# Altium schematic symbol library jlcpcb_2025_04_inductors_extended_0603.schlib: 1269 symbols (part 6 of 7) (continued)
## SDWL1608C24NJSTF
designator L?  Inductance: 24nH
Inductor, 24nH, ±5%, 190mΩ, 490mA, SMD 0603; Manufacturer: Sunlord; Manufacturer Part Number: SDWL1608C24NJSTF; Package Size: 0603; JLCPCB Basic Part: No; JLCPCB Part Number: C334264; Supplier 1: LCSC; Category: Inductors; Supplier Part Number 1: C334264; Tolerance: ±5%; Rated Current: 490mA; DC Resistance: 190mΩ; RoHS: Yes; ComponentLink1Description: Datasheet; ComponentLink1URL: https://wmsc.lcsc.com/wmsc/upload/file/pdf/v2/lcsc/2110081430_Sunlord-SDWL1608C24NJSTF_C334264.pdf; ComponentLink2Description: JLCPCB Part URL; ComponentLink2URL: https://jlcpcb.com/partdetail/C334264; ComponentLink3Description: LCSC Part URL; ComponentLink3URL: https://lcsc.com/product-detail/Inductors-SMD_Sunlord-Sunlord-SDWL1608C24NJSTF_C334264.html
footprint IND-0603 (0603 (1608M) Inductor)
pins: 1, 2

## SDWL1608C24NJSTFM01
designator L?  Inductance: 24nH
Inductor, 24nH, ±5%, 210mΩ, 500mA, SMD 0603; Manufacturer: Sunlord; Manufacturer Part Number: SDWL1608C24NJSTFM01; Self-Resonant Frequency: 100MHz; Q Factor: 40@250MHz; Package Size: 0603; JLCPCB Basic Part: No; JLCPCB Part Number: C408735; Supplier 1: LCSC; Category: Inductors; Supplier Part Number 1: C408735; Tolerance: ±5%; Rated Current: 500mA; DC Resistance: 210mΩ; RoHS: Yes; ComponentLink1Description: Datasheet; ComponentLink1URL: https://wmsc.lcsc.com/wmsc/upload/file/pdf/v2/lcsc/2110081530_Sunlord-SDWL1608C24NJSTFM01_C408735.pdf; ComponentLink2Description: JLCPCB Part URL; ComponentLink2URL: https://jlcpcb.com/partdetail/C408735; ComponentLink3Description: LCSC Part URL; ComponentLink3URL: https://lcsc.com/product-detail/Inductors-SMD_Sunlord-Sunlord-SDWL1608C24NJSTFM01_C408735.html
footprint IND-0603 (0603 (1608M) Inductor)
pins: 1, 2

## SDWL1608C27NGSTF
designator L?  Inductance: 27nH
Inductor, 27nH, ±2%, 190mΩ, 490mA, SMD 0603; Manufacturer: Sunlord; Manufacturer Part Number: SDWL1608C27NGSTF; Package Size: 0603; JLCPCB Basic Part: No; JLCPCB Part Number: C370332; Supplier 1: LCSC; Category: Inductors; Supplier Part Number 1: C370332; Tolerance: ±2%; Rated Current: 490mA; DC Resistance: 190mΩ; RoHS: Yes; ComponentLink1Description: Datasheet; ComponentLink1URL: https://wmsc.lcsc.com/wmsc/upload/file/pdf/v2/lcsc/2110081530_Sunlord-SDWL1608C27NGSTF_C370332.pdf; ComponentLink2Description: JLCPCB Part URL; ComponentLink2URL: https://jlcpcb.com/partdetail/C370332; ComponentLink3Description: LCSC Part URL; ComponentLink3URL: https://lcsc.com/product-detail/Inductors-SMD_Sunlord-Sunlord-SDWL1608C27NGSTF_C370332.html
footprint IND-0603 (0603 (1608M) Inductor)
pins: 1, 2

## SDWL1608C27NGSTFN01
designator L?  Inductance: 27nH
Inductor, 27nH, ±2%, SMD 0603; Manufacturer: Sunlord; Manufacturer Part Number: SDWL1608C27NGSTFN01; Package Size: 0603; JLCPCB Basic Part: No; JLCPCB Part Number: C2988097; Supplier 1: LCSC; Category: Inductors; Supplier Part Number 1: C2988097; Tolerance: ±2%; RoHS: Yes; ComponentLink1Description: Datasheet; ComponentLink1URL: https://wmsc.lcsc.com/wmsc/upload/file/pdf/v2/lcsc/2204021230_Sunlord-SDWL1608C27NGSTFN01_C2988097.pdf; ComponentLink2Description: JLCPCB Part URL; ComponentLink2URL: https://jlcpcb.com/partdetail/C2988097; ComponentLink3Description: LCSC Part URL; ComponentLink3URL: https://lcsc.com/product-detail/Inductors-SMD_Sunlord-Sunlord-SDWL1608C27NGSTFN01_C2988097.html
footprint IND-0603 (0603 (1608M) Inductor)
pins: 1, 2

## SDWL1608C27NJSTF
designator L?  Inductance: 27nH
Inductor, 27nH, ±5%, 190mΩ, 490mA, SMD 0603; Manufacturer: Sunlord; Manufacturer Part Number: SDWL1608C27NJSTF; Package Size: 0603; JLCPCB Basic Part: No; JLCPCB Part Number: C316380; Supplier 1: LCSC; Category: Inductors; Supplier Part Number 1: C316380; Tolerance: ±5%; Rated Current: 490mA; DC Resistance: 190mΩ; RoHS: Yes; ComponentLink1Description: Datasheet; ComponentLink1URL: https://wmsc.lcsc.com/wmsc/upload/file/pdf/v2/lcsc/2110081430_Sunlord-SDWL1608C27NJSTF_C316380.pdf; ComponentLink2Description: JLCPCB Part URL; ComponentLink2URL: https://jlcpcb.com/partdetail/C316380; ComponentLink3Description: LCSC Part URL; ComponentLink3URL: https://lcsc.com/product-detail/Inductors-SMD_Sunlord-Sunlord-SDWL1608C27NJSTF_C316380.html
footprint IND-0603 (0603 (1608M) Inductor)
pins: 1, 2

## SDWL1608C27NJSTFM01
designator L?  Inductance: 27nH
Inductor, 27nH, ±5%, 210mΩ, 440mA, SMD 0603; Manufacturer: Sunlord; Manufacturer Part Number: SDWL1608C27NJSTFM01; Self-Resonant Frequency: 100MHz; Q Factor: 40@250MHz; Package Size: 0603; JLCPCB Basic Part: No; JLCPCB Part Number: C408736; Supplier 1: LCSC; Category: Inductors; Supplier Part Number 1: C408736; Tolerance: ±5%; Rated Current: 440mA; DC Resistance: 210mΩ; RoHS: Yes; ComponentLink1Description: Datasheet; ComponentLink1URL: https://wmsc.lcsc.com/wmsc/upload/file/pdf/v2/lcsc/2110081530_Sunlord-SDWL1608C27NJSTFM01_C408736.pdf; ComponentLink2Description: JLCPCB Part URL; ComponentLink2URL: https://jlcpcb.com/partdetail/C408736; ComponentLink3Description: LCSC Part URL; ComponentLink3URL: https://lcsc.com/product-detail/Inductors-SMD_Sunlord-Sunlord-SDWL1608C27NJSTFM01_C408736.html
footprint IND-0603 (0603 (1608M) Inductor)
pins: 1, 2

## SDWL1608C30NJSTF
designator L?  Inductance: 30nH
Inductor, 30nH, ±5%, 210mΩ, 470mA, SMD 0603; Manufacturer: Sunlord; Manufacturer Part Number: SDWL1608C30NJSTF; Package Size: 0603; JLCPCB Basic Part: No; JLCPCB Part Number: C66288; Supplier 1: LCSC; Category: Inductors; Supplier Part Number 1: C66288; Tolerance: ±5%; Rated Current: 470mA; DC Resistance: 210mΩ; RoHS: Yes; ComponentLink1Description: Datasheet; ComponentLink1URL: https://wmsc.lcsc.com/wmsc/upload/file/pdf/v2/lcsc/2110081230_Sunlord-SDWL1608C30NJSTF_C66288.pdf; ComponentLink2Description: JLCPCB Part URL; ComponentLink2URL: https://jlcpcb.com/partdetail/C66288; ComponentLink3Description: LCSC Part URL; ComponentLink3URL: https://lcsc.com/product-detail/Inductors-SMD_Sunlord-Sunlord-SDWL1608C30NJSTF_C66288.html
footprint IND-0603 (0603 (1608M) Inductor)
pins: 1, 2

## SDWL1608C30NJSTFM01
designator L?  Inductance: 30nH
Inductor, 30nH, ±5%, 230mΩ, 420mA, SMD 0603; Manufacturer: Sunlord; Manufacturer Part Number: SDWL1608C30NJSTFM01; Self-Resonant Frequency: 100MHz; Q Factor: 40@250MHz; Package Size: 0603; JLCPCB Basic Part: No; JLCPCB Part Number: C408737; Supplier 1: LCSC; Category: Inductors; Supplier Part Number 1: C408737; Tolerance: ±5%; Rated Current: 420mA; DC Resistance: 230mΩ; RoHS: Yes; ComponentLink1Description: Datasheet; ComponentLink1URL: https://wmsc.lcsc.com/wmsc/upload/file/pdf/v2/lcsc/2110081530_Sunlord-SDWL1608C30NJSTFM01_C408737.pdf; ComponentLink2Description: JLCPCB Part URL; ComponentLink2URL: https://jlcpcb.com/partdetail/C408737; ComponentLink3Description: LCSC Part URL; ComponentLink3URL: https://lcsc.com/product-detail/Inductors-SMD_Sunlord-Sunlord-SDWL1608C30NJSTFM01_C408737.html
footprint IND-0603 (0603 (1608M) Inductor)
pins: 1, 2

## SDWL1608C33NGSTF
designator L?  Inductance: 33nH
Inductor, 33nH, ±2%, 210mΩ, 470mA, SMD 0603; Manufacturer: Sunlord; Manufacturer Part Number: SDWL1608C33NGSTF; Package Size: 0603; JLCPCB Basic Part: No; JLCPCB Part Number: C370337; Supplier 1: LCSC; Category: Inductors; Supplier Part Number 1: C370337; Tolerance: ±2%; Rated Current: 470mA; DC Resistance: 210mΩ; RoHS: Yes; ComponentLink1Description: Datasheet; ComponentLink1URL: https://wmsc.lcsc.com/wmsc/upload/file/pdf/v2/lcsc/2110081530_Sunlord-SDWL1608C33NGSTF_C370337.pdf; ComponentLink2Description: JLCPCB Part URL; ComponentLink2URL: https://jlcpcb.com/partdetail/C370337; ComponentLink3Description: LCSC Part URL; ComponentLink3URL: https://lcsc.com/product-detail/Inductors-SMD_Sunlord-Sunlord-SDWL1608C33NGSTF_C370337.html
footprint IND-0603 (0603 (1608M) Inductor)
pins: 1, 2

## SDWL1608C33NGSTFN01
designator L?  Inductance: 33nH
Inductor, 33nH, ±2%, SMD 0603; Manufacturer: Sunlord; Manufacturer Part Number: SDWL1608C33NGSTFN01; Package Size: 0603; JLCPCB Basic Part: No; JLCPCB Part Number: C370338; Supplier 1: LCSC; Category: Inductors; Supplier Part Number 1: C370338; Tolerance: ±2%; RoHS: Yes; ComponentLink1Description: Datasheet; ComponentLink2Description: JLCPCB Part URL; ComponentLink2URL: https://jlcpcb.com/partdetail/C370338; ComponentLink3Description: LCSC Part URL; ComponentLink3URL: https://lcsc.com/product-detail/Inductors-SMD_Sunlord-Sunlord-SDWL1608C33NGSTFN01_C370338.html
footprint IND-0603 (0603 (1608M) Inductor)
pins: 1, 2

## SDWL1608C33NJSTF
designator L?  Inductance: 33nH
Inductor, 33nH, ±5%, 210mΩ, 470mA, SMD 0603; Manufacturer: Sunlord; Manufacturer Part Number: SDWL1608C33NJSTF; Package Size: 0603; JLCPCB Basic Part: No; JLCPCB Part Number: C316379; Supplier 1: LCSC; Category: Inductors; Supplier Part Number 1: C316379; Tolerance: ±5%; Rated Current: 470mA; DC Resistance: 210mΩ; RoHS: Yes; ComponentLink1Description: Datasheet; ComponentLink1URL: https://wmsc.lcsc.com/wmsc/upload/file/pdf/v2/lcsc/2110081430_Sunlord-SDWL1608C33NJSTF_C316379.pdf; ComponentLink2Description: JLCPCB Part URL; ComponentLink2URL: https://jlcpcb.com/partdetail/C316379; ComponentLink3Description: LCSC Part URL; ComponentLink3URL: https://lcsc.com/product-detail/Inductors-SMD_Sunlord-Sunlord-SDWL1608C33NJSTF_C316379.html
footprint IND-0603 (0603 (1608M) Inductor)
pins: 1, 2

## SDWL1608C33NJSTFM01
designator L?  Inductance: 33nH
Inductor, 33nH, ±5%, 230mΩ, 420mA, SMD 0603; Manufacturer: Sunlord; Manufacturer Part Number: SDWL1608C33NJSTFM01; Package Size: 0603; JLCPCB Basic Part: No; JLCPCB Part Number: C408738; Supplier 1: LCSC; Category: Inductors; Supplier Part Number 1: C408738; Tolerance: ±5%; Rated Current: 420mA; DC Resistance: 230mΩ; RoHS: Yes; ComponentLink1Description: Datasheet; ComponentLink1URL: https://wmsc.lcsc.com/wmsc/upload/file/pdf/v2/lcsc/2110081530_Sunlord-SDWL1608C33NJSTFM01_C408738.pdf; ComponentLink2Description: JLCPCB Part URL; ComponentLink2URL: https://jlcpcb.com/partdetail/C408738; ComponentLink3Description: LCSC Part URL; ComponentLink3URL: https://lcsc.com/product-detail/Inductors-SMD_Sunlord-Sunlord-SDWL1608C33NJSTFM01_C408738.html
footprint IND-0603 (0603 (1608M) Inductor)
pins: 1, 2

## SDWL1608C36NJSTFM01
designator L?  Inductance: 36nH
Inductor, 36nH, ±5%, 400mA, SMD 0603; Manufacturer: Sunlord; Manufacturer Part Number: SDWL1608C36NJSTFM01; Self-Resonant Frequency: 100MHz; Q Factor: 40@250MHz; Package Size: 0603; JLCPCB Basic Part: No; JLCPCB Part Number: C361614; Supplier 1: LCSC; Category: Inductors; Supplier Part Number 1: C361614; Tolerance: ±5%; Rated Current: 400mA; RoHS: Yes; ComponentLink1Description: Datasheet; ComponentLink1URL: https://wmsc.lcsc.com/wmsc/upload/file/pdf/v2/lcsc/2110081430_Sunlord-SDWL1608C36NJSTFM01_C361614.pdf; ComponentLink2Description: JLCPCB Part URL; ComponentLink2URL: https://jlcpcb.com/partdetail/C361614; ComponentLink3Description: LCSC Part URL; ComponentLink3URL: https://lcsc.com/product-detail/Inductors-SMD_Sunlord-Sunlord-SDWL1608C36NJSTFM01_C361614.html
footprint IND-0603 (0603 (1608M) Inductor)
pins: 1, 2

## SDWL1608C39NGSTF
designator L?  Inductance: 39nH
Inductor, 39nH, ±2%, 220mΩ, 460mA, SMD 0603; Manufacturer: Sunlord; Manufacturer Part Number: SDWL1608C39NGSTF; Package Size: 0603; JLCPCB Basic Part: No; JLCPCB Part Number: C370339; Supplier 1: LCSC; Category: Inductors; Supplier Part Number 1: C370339; Tolerance: ±2%; Rated Current: 460mA; DC Resistance: 220mΩ; RoHS: Yes; ComponentLink1Description: Datasheet; ComponentLink1URL: https://wmsc.lcsc.com/wmsc/upload/file/pdf/v2/lcsc/2110081530_Sunlord-SDWL1608C39NGSTF_C370339.pdf; ComponentLink2Description: JLCPCB Part URL; ComponentLink2URL: https://jlcpcb.com/partdetail/C370339; ComponentLink3Description: LCSC Part URL; ComponentLink3URL: https://lcsc.com/product-detail/Inductors-SMD_Sunlord-Sunlord-SDWL1608C39NGSTF_C370339.html
footprint IND-0603 (0603 (1608M) Inductor)
pins: 1, 2

## SDWL1608C39NGSTFN01
designator L?  Inductance: 39nH
Inductor, 39nH, ±2%, SMD 0603; Manufacturer: Sunlord; Manufacturer Part Number: SDWL1608C39NGSTFN01; Package Size: 0603; JLCPCB Basic Part: No; JLCPCB Part Number: C370340; Supplier 1: LCSC; Category: Inductors; Supplier Part Number 1: C370340; Tolerance: ±2%; RoHS: Yes; ComponentLink1Description: Datasheet; ComponentLink2Description: JLCPCB Part URL; ComponentLink2URL: https://jlcpcb.com/partdetail/C370340; ComponentLink3Description: LCSC Part URL; ComponentLink3URL: https://lcsc.com/product-detail/Inductors-SMD_Sunlord-Sunlord-SDWL1608C39NGSTFN01_C370340.html
footprint IND-0603 (0603 (1608M) Inductor)
pins: 1, 2

## SDWL1608C39NJSTF
designator L?  Inductance: 39nH
Inductor, 39nH, ±5%, 220mΩ, 460mA, SMD 0603; Manufacturer: Sunlord; Manufacturer Part Number: SDWL1608C39NJSTF; Package Size: 0603; JLCPCB Basic Part: No; JLCPCB Part Number: C316378; Supplier 1: LCSC; Category: Inductors; Supplier Part Number 1: C316378; Tolerance: ±5%; Rated Current: 460mA; DC Resistance: 220mΩ; RoHS: Yes; ComponentLink1Description: Datasheet; ComponentLink1URL: https://wmsc.lcsc.com/wmsc/upload/file/pdf/v2/lcsc/2110081430_Sunlord-SDWL1608C39NJSTF_C316378.pdf; ComponentLink2Description: JLCPCB Part URL; ComponentLink2URL: https://jlcpcb.com/partdetail/C316378; ComponentLink3Description: LCSC Part URL; ComponentLink3URL: https://lcsc.com/product-detail/Inductors-SMD_Sunlord-Sunlord-SDWL1608C39NJSTF_C316378.html
footprint IND-0603 (0603 (1608M) Inductor)
pins: 1, 2

## SDWL1608C39NJSTFM01
designator L?  Inductance: 39nH
Inductor, 39nH, ±5%, 260mΩ, 400mA, SMD 0603; Manufacturer: Sunlord; Manufacturer Part Number: SDWL1608C39NJSTFM01; Self-Resonant Frequency: 100MHz; Q Factor: 40@250MHz; Package Size: 0603; JLCPCB Basic Part: No; JLCPCB Part Number: C408739; Supplier 1: LCSC; Category: Inductors; Supplier Part Number 1: C408739; Tolerance: ±5%; Rated Current: 400mA; DC Resistance: 260mΩ; RoHS: Yes; ComponentLink1Description: Datasheet; ComponentLink1URL: https://wmsc.lcsc.com/wmsc/upload/file/pdf/v2/lcsc/2110081530_Sunlord-SDWL1608C39NJSTFM01_C408739.pdf; ComponentLink2Description: JLCPCB Part URL; ComponentLink2URL: https://jlcpcb.com/partdetail/C408739; ComponentLink3Description: LCSC Part URL; ComponentLink3URL: https://lcsc.com/product-detail/Inductors-SMD_Sunlord-Sunlord-SDWL1608C39NJSTFM01_C408739.html
footprint IND-0603 (0603 (1608M) Inductor)
pins: 1, 2

## SDWL1608C43NJSTFM01
designator L?  Inductance: 43nH
Inductor, 43nH, ±5%, 290mΩ, 380mA, SMD 0603; Manufacturer: Sunlord; Manufacturer Part Number: SDWL1608C43NJSTFM01; Self-Resonant Frequency: 100MHz; Q Factor: 40@200MHz; Package Size: 0603; JLCPCB Basic Part: No; JLCPCB Part Number: C408740; Supplier 1: LCSC; Category: Inductors; Supplier Part Number 1: C408740; Tolerance: ±5%; Rated Current: 380mA; DC Resistance: 290mΩ; RoHS: Yes; ComponentLink1Description: Datasheet; ComponentLink1URL: https://wmsc.lcsc.com/wmsc/upload/file/pdf/v2/lcsc/2110081530_Sunlord-SDWL1608C43NJSTFM01_C408740.pdf; ComponentLink2Description: JLCPCB Part URL; ComponentLink2URL: https://jlcpcb.com/partdetail/C408740; ComponentLink3Description: LCSC Part URL; ComponentLink3URL: https://lcsc.com/product-detail/Inductors-SMD_Sunlord-Sunlord-SDWL1608C43NJSTFM01_C408740.html
footprint IND-0603 (0603 (1608M) Inductor)
pins: 1, 2

## SDWL1608C47NGSTF
designator L?  Inductance: 47nH
Inductor, 47nH, ±2%, 270mΩ, 400mA, SMD 0603; Manufacturer: Sunlord; Manufacturer Part Number: SDWL1608C47NGSTF; Package Size: 0603; JLCPCB Basic Part: No; JLCPCB Part Number: C370345; Supplier 1: LCSC; Category: Inductors; Supplier Part Number 1: C370345; Tolerance: ±2%; Rated Current: 400mA; DC Resistance: 270mΩ; RoHS: Yes; ComponentLink1Description: Datasheet; ComponentLink1URL: https://wmsc.lcsc.com/wmsc/upload/file/pdf/v2/lcsc/2110081530_Sunlord-SDWL1608C47NGSTF_C370345.pdf; ComponentLink2Description: JLCPCB Part URL; ComponentLink2URL: https://jlcpcb.com/partdetail/C370345; ComponentLink3Description: LCSC Part URL; ComponentLink3URL: https://lcsc.com/product-detail/Inductors-SMD_Sunlord-Sunlord-SDWL1608C47NGSTF_C370345.html
footprint IND-0603 (0603 (1608M) Inductor)
pins: 1, 2

## SDWL1608C47NJSTF
designator L?  Inductance: 47nH
Inductor, 47nH, ±5%, 270mΩ, 400mA, SMD 0603; Manufacturer: Sunlord; Manufacturer Part Number: SDWL1608C47NJSTF; Package Size: 0603; JLCPCB Basic Part: No; JLCPCB Part Number: C60035; Supplier 1: LCSC; Category: Inductors; Supplier Part Number 1: C60035; Tolerance: ±5%; Rated Current: 400mA; DC Resistance: 270mΩ; RoHS: Yes; ComponentLink1Description: Datasheet; ComponentLink1URL: https://wmsc.lcsc.com/wmsc/upload/file/pdf/v2/lcsc/2110081230_Sunlord-SDWL1608C47NJSTF_C60035.pdf; ComponentLink2Description: JLCPCB Part URL; ComponentLink2URL: https://jlcpcb.com/partdetail/C60035; ComponentLink3Description: LCSC Part URL; ComponentLink3URL: https://lcsc.com/product-detail/Inductors-SMD_Sunlord-Sunlord-SDWL1608C47NJSTF_C60035.html
footprint IND-0603 (0603 (1608M) Inductor)
pins: 1, 2

## SDWL1608C47NJSTFM01
designator L?  Inductance: 47nH
Inductor, 47nH, ±5%, 290mΩ, 380mA, SMD 0603; Manufacturer: Sunlord; Manufacturer Part Number: SDWL1608C47NJSTFM01; Self-Resonant Frequency: 100MHz; Q Factor: 38@200MHz; Package Size: 0603; JLCPCB Basic Part: No; JLCPCB Part Number: C408741; Supplier 1: LCSC; Category: Inductors; Supplier Part Number 1: C408741; Tolerance: ±5%; Rated Current: 380mA; DC Resistance: 290mΩ; RoHS: Yes; ComponentLink1Description: Datasheet; ComponentLink1URL: https://wmsc.lcsc.com/wmsc/upload/file/pdf/v2/lcsc/2110081530_Sunlord-SDWL1608C47NJSTFM01_C408741.pdf; ComponentLink2Description: JLCPCB Part URL; ComponentLink2URL: https://jlcpcb.com/partdetail/C408741; ComponentLink3Description: LCSC Part URL; ComponentLink3URL: https://lcsc.com/product-detail/Inductors-SMD_Sunlord-Sunlord-SDWL1608C47NJSTFM01_C408741.html
footprint IND-0603 (0603 (1608M) Inductor)
pins: 1, 2

## SDWL1608C51NJSTFM01
designator L?  Inductance: 51nH
Inductor, 51nH, ±5%, 330mΩ, 370mA, SMD 0603; Manufacturer: Sunlord; Manufacturer Part Number: SDWL1608C51NJSTFM01; Self-Resonant Frequency: 100MHz; Q Factor: 38@200MHz; Package Size: 0603; JLCPCB Basic Part: No; JLCPCB Part Number: C408742; Supplier 1: LCSC; Category: Inductors; Supplier Part Number 1: C408742; Tolerance: ±5%; Rated Current: 370mA; DC Resistance: 330mΩ; RoHS: Yes; ComponentLink1Description: Datasheet; ComponentLink1URL: https://wmsc.lcsc.com/wmsc/upload/file/pdf/v2/lcsc/2110081530_Sunlord-SDWL1608C51NJSTFM01_C408742.pdf; ComponentLink2Description: JLCPCB Part URL; ComponentLink2URL: https://jlcpcb.com/partdetail/C408742; ComponentLink3Description: LCSC Part URL; ComponentLink3URL: https://lcsc.com/product-detail/Inductors-SMD_Sunlord-Sunlord-SDWL1608C51NJSTFM01_C408742.html
footprint IND-0603 (0603 (1608M) Inductor)
pins: 1, 2

## SDWL1608C56NGSTF
designator L?  Inductance: 56nH
Inductor, 56nH, ±2%, 350mΩ, 360mA, SMD 0603; Manufacturer: Sunlord; Manufacturer Part Number: SDWL1608C56NGSTF; Package Size: 0603; JLCPCB Basic Part: No; JLCPCB Part Number: C370349; Supplier 1: LCSC; Category: Inductors; Supplier Part Number 1: C370349; Tolerance: ±2%; Rated Current: 360mA; DC Resistance: 350mΩ; RoHS: Yes; ComponentLink1Description: Datasheet; ComponentLink1URL: https://wmsc.lcsc.com/wmsc/upload/file/pdf/v2/lcsc/2110081530_Sunlord-SDWL1608C56NGSTF_C370349.pdf; ComponentLink2Description: JLCPCB Part URL; ComponentLink2URL: https://jlcpcb.com/partdetail/C370349; ComponentLink3Description: LCSC Part URL; ComponentLink3URL: https://lcsc.com/product-detail/Inductors-SMD_Sunlord-Sunlord-SDWL1608C56NGSTF_C370349.html
footprint IND-0603 (0603 (1608M) Inductor)
pins: 1, 2

## SDWL1608C56NJSTF
designator L?  Inductance: 56nH
Inductor, 56nH, ±5%, 350mΩ, 360mA, SMD 0603; Manufacturer: Sunlord; Manufacturer Part Number: SDWL1608C56NJSTF; Package Size: 0603; JLCPCB Basic Part: No; JLCPCB Part Number: C334265; Supplier 1: LCSC; Category: Inductors; Supplier Part Number 1: C334265; Tolerance: ±5%; Rated Current: 360mA; DC Resistance: 350mΩ; RoHS: Yes; ComponentLink1Description: Datasheet; ComponentLink1URL: https://wmsc.lcsc.com/wmsc/upload/file/pdf/v2/lcsc/2110081430_Sunlord-SDWL1608C56NJSTF_C334265.pdf; ComponentLink2Description: JLCPCB Part URL; ComponentLink2URL: https://jlcpcb.com/partdetail/C334265; ComponentLink3Description: LCSC Part URL; ComponentLink3URL: https://lcsc.com/product-detail/Inductors-SMD_Sunlord-Sunlord-SDWL1608C56NJSTF_C334265.html
footprint IND-0603 (0603 (1608M) Inductor)
pins: 1, 2

## SDWL1608C62NJSTFM01
designator L?  Inductance: 62nH
Inductor, 62nH, ±5%, 510mΩ, 280mA, SMD 0603; Manufacturer: Sunlord; Manufacturer Part Number: SDWL1608C62NJSTFM01; Self-Resonant Frequency: 100MHz; Q Factor: 38@200MHz; Package Size: 0603; JLCPCB Basic Part: No; JLCPCB Part Number: C408744; Supplier 1: LCSC; Category: Inductors; Supplier Part Number 1: C408744; Tolerance: ±5%; Rated Current: 280mA; DC Resistance: 510mΩ; RoHS: Yes; ComponentLink1Description: Datasheet; ComponentLink1URL: https://wmsc.lcsc.com/wmsc/upload/file/pdf/v2/lcsc/2110081530_Sunlord-SDWL1608C62NJSTFM01_C408744.pdf; ComponentLink2Description: JLCPCB Part URL; ComponentLink2URL: https://jlcpcb.com/partdetail/C408744; ComponentLink3Description: LCSC Part URL; ComponentLink3URL: https://lcsc.com/product-detail/Inductors-SMD_Sunlord-Sunlord-SDWL1608C62NJSTFM01_C408744.html
footprint IND-0603 (0603 (1608M) Inductor)
pins: 1, 2

## SDWL1608C68NGSTF
designator L?  Inductance: 68nH
Inductor, 68nH, ±2%, 380mΩ, 350mA, SMD 0603; Manufacturer: Sunlord; Manufacturer Part Number: SDWL1608C68NGSTF; Package Size: 0603; JLCPCB Basic Part: No; JLCPCB Part Number: C370352; Supplier 1: LCSC; Category: Inductors; Supplier Part Number 1: C370352; Tolerance: ±2%; Rated Current: 350mA; DC Resistance: 380mΩ; RoHS: Yes; ComponentLink1Description: Datasheet; ComponentLink1URL: https://wmsc.lcsc.com/wmsc/upload/file/pdf/v2/lcsc/2110081530_Sunlord-SDWL1608C68NGSTF_C370352.pdf; ComponentLink2Description: JLCPCB Part URL; ComponentLink2URL: https://jlcpcb.com/partdetail/C370352; ComponentLink3Description: LCSC Part URL; ComponentLink3URL: https://lcsc.com/product-detail/Inductors-SMD_Sunlord-Sunlord-SDWL1608C68NGSTF_C370352.html
footprint IND-0603 (0603 (1608M) Inductor)
pins: 1, 2

## SDWL1608C68NGSTFN01
designator L?  Inductance: 68nH
Inductor, 68nH, ±2%, SMD 0603; Manufacturer: Sunlord; Manufacturer Part Number: SDWL1608C68NGSTFN01; Package Size: 0603; JLCPCB Basic Part: No; JLCPCB Part Number: C2988101; Supplier 1: LCSC; Category: Inductors; Supplier Part Number 1: C2988101; Tolerance: ±2%; RoHS: Yes; ComponentLink1Description: Datasheet; ComponentLink1URL: https://wmsc.lcsc.com/wmsc/upload/file/pdf/v2/lcsc/2204021230_Sunlord-SDWL1608C68NGSTFN01_C2988101.pdf; ComponentLink2Description: JLCPCB Part URL; ComponentLink2URL: https://jlcpcb.com/partdetail/C2988101; ComponentLink3Description: LCSC Part URL; ComponentLink3URL: https://lcsc.com/product-detail/Inductors-SMD_Sunlord-Sunlord-SDWL1608C68NGSTFN01_C2988101.html
footprint IND-0603 (0603 (1608M) Inductor)
pins: 1, 2

## SDWL1608C68NJSTF
designator L?  Inductance: 68nH
Inductor, 68nH, ±5%, 380mΩ, 350mA, SMD 0603; Manufacturer: Sunlord; Manufacturer Part Number: SDWL1608C68NJSTF; Package Size: 0603; JLCPCB Basic Part: No; JLCPCB Part Number: C334266; Supplier 1: LCSC; Category: Inductors; Supplier Part Number 1: C334266; Tolerance: ±5%; Rated Current: 350mA; DC Resistance: 380mΩ; RoHS: Yes; ComponentLink1Description: Datasheet; ComponentLink1URL: https://wmsc.lcsc.com/wmsc/upload/file/pdf/v2/lcsc/2110081430_Sunlord-SDWL1608C68NJSTF_C334266.pdf; ComponentLink2Description: JLCPCB Part URL; ComponentLink2URL: https://jlcpcb.com/partdetail/C334266; ComponentLink3Description: LCSC Part URL; ComponentLink3URL: https://lcsc.com/product-detail/Inductors-SMD_Sunlord-Sunlord-SDWL1608C68NJSTF_C334266.html
footprint IND-0603 (0603 (1608M) Inductor)
pins: 1, 2

## SDWL1608C68NJSTFM01
designator L?  Inductance: 68nH
Inductor, 68nH, ±5%, 380mΩ, 340mA, SMD 0603; Manufacturer: Sunlord; Manufacturer Part Number: SDWL1608C68NJSTFM01; Self-Resonant Frequency: 100MHz; Q Factor: 38@200MHz; Package Size: 0603; JLCPCB Basic Part: No; JLCPCB Part Number: C408745; Supplier 1: LCSC; Category: Inductors; Supplier Part Number 1: C408745; Tolerance: ±5%; Rated Current: 340mA; DC Resistance: 380mΩ; RoHS: Yes; ComponentLink1Description: Datasheet; ComponentLink1URL: https://wmsc.lcsc.com/wmsc/upload/file/pdf/v2/lcsc/2110081530_Sunlord-SDWL1608C68NJSTFM01_C408745.pdf; ComponentLink2Description: JLCPCB Part URL; ComponentLink2URL: https://jlcpcb.com/partdetail/C408745; ComponentLink3Description: LCSC Part URL; ComponentLink3URL: https://lcsc.com/product-detail/Inductors-SMD_Sunlord-Sunlord-SDWL1608C68NJSTFM01_C408745.html
footprint IND-0603 (0603 (1608M) Inductor)
pins: 1, 2

## SDWL1608C72NJSTF
designator L?  Inductance: 72nH
Inductor, 72nH, ±5%, 430mΩ, 320mA, SMD 0603; Manufacturer: Sunlord; Manufacturer Part Number: SDWL1608C72NJSTF; Package Size: 0603; JLCPCB Basic Part: No; JLCPCB Part Number: C316374; Supplier 1: LCSC; Category: Inductors; Supplier Part Number 1: C316374; Tolerance: ±5%; Rated Current: 320mA; DC Resistance: 430mΩ; RoHS: Yes; ComponentLink1Description: Datasheet; ComponentLink1URL: https://wmsc.lcsc.com/wmsc/upload/file/pdf/v2/lcsc/2110081430_Sunlord-SDWL1608C72NJSTF_C316374.pdf; ComponentLink2Description: JLCPCB Part URL; ComponentLink2URL: https://jlcpcb.com/partdetail/C316374; ComponentLink3Description: LCSC Part URL; ComponentLink3URL: https://lcsc.com/product-detail/Inductors-SMD_Sunlord-Sunlord-SDWL1608C72NJSTF_C316374.html
footprint IND-0603 (0603 (1608M) Inductor)
pins: 1, 2

## SDWL1608C72NJSTFM01
designator L?  Inductance: 72nH
Inductor, 72nH, ±5%, 560mΩ, 270mA, SMD 0603; Manufacturer: Sunlord; Manufacturer Part Number: SDWL1608C72NJSTFM01; Self-Resonant Frequency: 100MHz; Q Factor: 34@150MHz; Package Size: 0603; JLCPCB Basic Part: No; JLCPCB Part Number: C408746; Supplier 1: LCSC; Category: Inductors; Supplier Part Number 1: C408746; Tolerance: ±5%; Rated Current: 270mA; DC Resistance: 560mΩ; RoHS: Yes; ComponentLink1Description: Datasheet; ComponentLink1URL: https://wmsc.lcsc.com/wmsc/upload/file/pdf/v2/lcsc/2110081530_Sunlord-SDWL1608C72NJSTFM01_C408746.pdf; ComponentLink2Description: JLCPCB Part URL; ComponentLink2URL: https://jlcpcb.com/partdetail/C408746; ComponentLink3Description: LCSC Part URL; ComponentLink3URL: https://lcsc.com/product-detail/Inductors-SMD_Sunlord-Sunlord-SDWL1608C72NJSTFM01_C408746.html
footprint IND-0603 (0603 (1608M) Inductor)
pins: 1, 2

## SDWL1608C75NJSTFM01
designator L?  Inductance: 75nH
Inductor, 75nH, ±5%, 560mΩ, 270mA, SMD 0603; Manufacturer: Sunlord; Manufacturer Part Number: SDWL1608C75NJSTFM01; Self-Resonant Frequency: 100MHz; Q Factor: 34@150MHz; Package Size: 0603; JLCPCB Basic Part: No; JLCPCB Part Number: C408747; Supplier 1: LCSC; Category: Inductors; Supplier Part Number 1: C408747; Tolerance: ±5%; Rated Current: 270mA; DC Resistance: 560mΩ; RoHS: Yes; ComponentLink1Description: Datasheet; ComponentLink1URL: https://wmsc.lcsc.com/wmsc/upload/file/pdf/v2/lcsc/2110081530_Sunlord-SDWL1608C75NJSTFM01_C408747.pdf; ComponentLink2Description: JLCPCB Part URL; ComponentLink2URL: https://jlcpcb.com/partdetail/C408747; ComponentLink3Description: LCSC Part URL; ComponentLink3URL: https://lcsc.com/product-detail/Inductors-SMD_Sunlord-Sunlord-SDWL1608C75NJSTFM01_C408747.html
footprint IND-0603 (0603 (1608M) Inductor)
pins: 1, 2

## SDWL1608C82NGSTF
designator L?  Inductance: 82nH
Inductor, 82nH, ±2%, 500mΩ, 300mA, SMD 0603; Manufacturer: Sunlord; Manufacturer Part Number: SDWL1608C82NGSTF; Package Size: 0603; JLCPCB Basic Part: No; JLCPCB Part Number: C370354; Supplier 1: LCSC; Category: Inductors; Supplier Part Number 1: C370354; Tolerance: ±2%; Rated Current: 300mA; DC Resistance: 500mΩ; RoHS: Yes; ComponentLink1Description: Datasheet; ComponentLink1URL: https://wmsc.lcsc.com/wmsc/upload/file/pdf/v2/lcsc/2110081530_Sunlord-SDWL1608C82NGSTF_C370354.pdf; ComponentLink2Description: JLCPCB Part URL; ComponentLink2URL: https://jlcpcb.com/partdetail/C370354; ComponentLink3Description: LCSC Part URL; ComponentLink3URL: https://lcsc.com/product-detail/Inductors-SMD_Sunlord-Sunlord-SDWL1608C82NGSTF_C370354.html
footprint IND-0603 (0603 (1608M) Inductor)
pins: 1, 2

## SDWL1608C82NGSTFN01
designator L?  Inductance: 82nH
Inductor, 82nH, ±2%, SMD 0603; Manufacturer: Sunlord; Manufacturer Part Number: SDWL1608C82NGSTFN01; Package Size: 0603; JLCPCB Basic Part: No; JLCPCB Part Number: C2988102; Supplier 1: LCSC; Category: Inductors; Supplier Part Number 1: C2988102; Tolerance: ±2%; RoHS: Yes; ComponentLink1Description: Datasheet; ComponentLink1URL: https://wmsc.lcsc.com/wmsc/upload/file/pdf/v2/lcsc/2204021230_Sunlord-SDWL1608C82NGSTFN01_C2988102.pdf; ComponentLink2Description: JLCPCB Part URL; ComponentLink2URL: https://jlcpcb.com/partdetail/C2988102; ComponentLink3Description: LCSC Part URL; ComponentLink3URL: https://lcsc.com/product-detail/Inductors-SMD_Sunlord-Sunlord-SDWL1608C82NGSTFN01_C2988102.html
footprint IND-0603 (0603 (1608M) Inductor)
pins: 1, 2

## SDWL1608C82NJSTF
designator L?  Inductance: 82nH
Inductor, 82nH, ±5%, 500mΩ, 300mA, SMD 0603; Manufacturer: Sunlord; Manufacturer Part Number: SDWL1608C82NJSTF; Package Size: 0603; JLCPCB Basic Part: No; JLCPCB Part Number: C316373; Supplier 1: LCSC; Category: Inductors; Supplier Part Number 1: C316373; Tolerance: ±5%; Rated Current: 300mA; DC Resistance: 500mΩ; RoHS: Yes; ComponentLink1Description: Datasheet; ComponentLink1URL: https://wmsc.lcsc.com/wmsc/upload/file/pdf/v2/lcsc/2110081430_Sunlord-SDWL1608C82NJSTF_C316373.pdf; ComponentLink2Description: JLCPCB Part URL; ComponentLink2URL: https://jlcpcb.com/partdetail/C316373; ComponentLink3Description: LCSC Part URL; ComponentLink3URL: https://lcsc.com/product-detail/Inductors-SMD_Sunlord-Sunlord-SDWL1608C82NJSTF_C316373.html
footprint IND-0603 (0603 (1608M) Inductor)
pins: 1, 2

## SDWL1608C82NJSTFM01
designator L?  Inductance: 82nH
Inductor, 82nH, ±5%, 600mΩ, 250mA, SMD 0603; Manufacturer: Sunlord; Manufacturer Part Number: SDWL1608C82NJSTFM01; Self-Resonant Frequency: 100MHz; Q Factor: 34@150MHz; Package Size: 0603; JLCPCB Basic Part: No; JLCPCB Part Number: C408748; Supplier 1: LCSC; Category: Inductors; Supplier Part Number 1: C408748; Tolerance: ±5%; Rated Current: 250mA; DC Resistance: 600mΩ; RoHS: Yes; ComponentLink1Description: Datasheet; ComponentLink1URL: https://wmsc.lcsc.com/wmsc/upload/file/pdf/v2/lcsc/2110081530_Sunlord-SDWL1608C82NJSTFM01_C408748.pdf; ComponentLink2Description: JLCPCB Part URL; ComponentLink2URL: https://jlcpcb.com/partdetail/C408748; ComponentLink3Description: LCSC Part URL; ComponentLink3URL: https://lcsc.com/product-detail/Inductors-SMD_Sunlord-Sunlord-SDWL1608C82NJSTFM01_C408748.html
footprint IND-0603 (0603 (1608M) Inductor)
pins: 1, 2

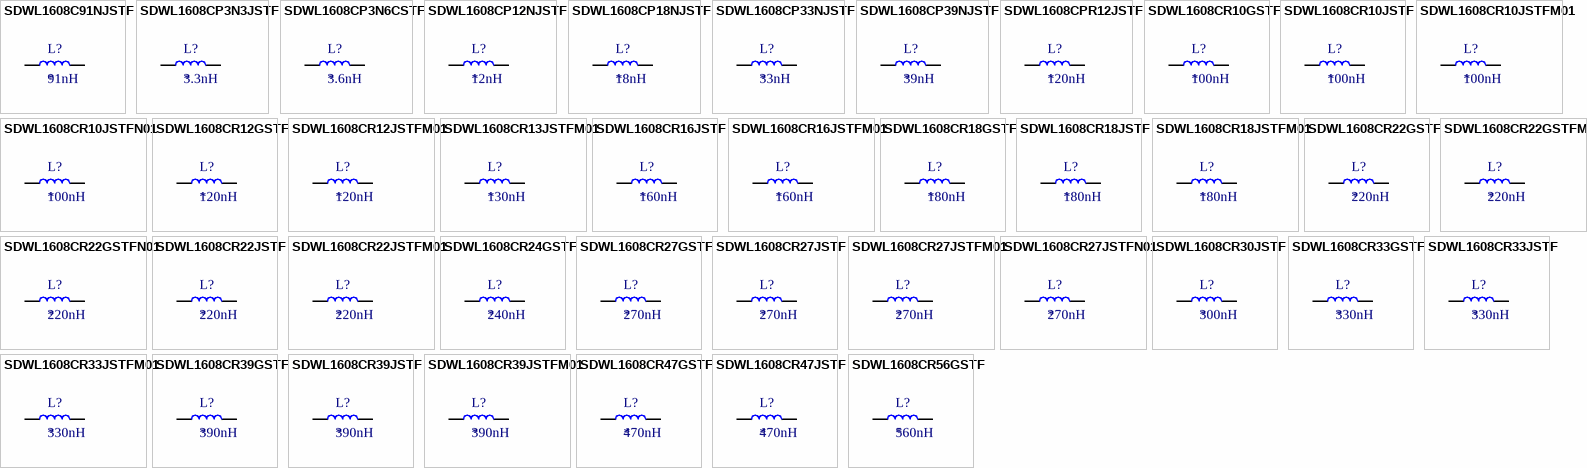
[diagram p29: symbols SDWL1608C91NJSTF to SDWL1608CR56GSTF]

## SDWL1608C91NJSTF
designator L?  Inductance: 91nH
Inductor, 91nH, ±5%, 520mΩ, 300mA, SMD 0603; Manufacturer: Sunlord; Manufacturer Part Number: SDWL1608C91NJSTF; Package Size: 0603; JLCPCB Basic Part: No; JLCPCB Part Number: C316372; Supplier 1: LCSC; Category: Inductors; Supplier Part Number 1: C316372; Tolerance: ±5%; Rated Current: 300mA; DC Resistance: 520mΩ; RoHS: Yes; ComponentLink1Description: Datasheet; ComponentLink1URL: https://wmsc.lcsc.com/wmsc/upload/file/pdf/v2/lcsc/2110081430_Sunlord-SDWL1608C91NJSTF_C316372.pdf; ComponentLink2Description: JLCPCB Part URL; ComponentLink2URL: https://jlcpcb.com/partdetail/C316372; ComponentLink3Description: LCSC Part URL; ComponentLink3URL: https://lcsc.com/product-detail/Inductors-SMD_Sunlord-Sunlord-SDWL1608C91NJSTF_C316372.html
footprint IND-0603 (0603 (1608M) Inductor)
pins: 1, 2

## SDWL1608CP3N3JSTF
designator L?  Inductance: 3.3nH
Inductor, 3.3nH, ±5%, 30mΩ, 1.9A, SMD 0603; Manufacturer: Sunlord; Manufacturer Part Number: SDWL1608CP3N3JSTF; Package Size: 0603; JLCPCB Basic Part: No; JLCPCB Part Number: C370357; Supplier 1: LCSC; Category: Inductors; Supplier Part Number 1: C370357; Tolerance: ±5%; Rated Current: 1.9A; DC Resistance: 30mΩ; RoHS: Yes; ComponentLink1Description: Datasheet; ComponentLink1URL: https://wmsc.lcsc.com/wmsc/upload/file/pdf/v2/lcsc/2110081530_Sunlord-SDWL1608CP3N3JSTF_C370357.pdf; ComponentLink2Description: JLCPCB Part URL; ComponentLink2URL: https://jlcpcb.com/partdetail/C370357; ComponentLink3Description: LCSC Part URL; ComponentLink3URL: https://lcsc.com/product-detail/Inductors-SMD_Sunlord-Sunlord-SDWL1608CP3N3JSTF_C370357.html
footprint IND-0603 (0603 (1608M) Inductor)
pins: 1, 2

## SDWL1608CP3N6CSTF
designator L?  Inductance: 3.6nH
Inductor, 3.6nH, 31mΩ, 1.9A, SMD 0603; Manufacturer: Sunlord; Manufacturer Part Number: SDWL1608CP3N6CSTF; Self-Resonant Frequency: 250MHz; Q Factor: 40@250MHz; Package Size: 0603; JLCPCB Basic Part: No; JLCPCB Part Number: C370358; Supplier 1: LCSC; Category: Inductors; Supplier Part Number 1: C370358; Rated Current: 1.9A; DC Resistance: 31mΩ; RoHS: Yes; ComponentLink1Description: Datasheet; ComponentLink1URL: https://wmsc.lcsc.com/wmsc/upload/file/pdf/v2/lcsc/2110081530_Sunlord-SDWL1608CP3N6CSTF_C370358.pdf; ComponentLink2Description: JLCPCB Part URL; ComponentLink2URL: https://jlcpcb.com/partdetail/C370358; ComponentLink3Description: LCSC Part URL; ComponentLink3URL: https://lcsc.com/product-detail/Inductors-SMD_Sunlord-Sunlord-SDWL1608CP3N6CSTF_C370358.html
footprint IND-0603 (0603 (1608M) Inductor)
pins: 1, 2

## SDWL1608CP12NJSTF
designator L?  Inductance: 12nH
Inductor, 12nH, ±5%, 115mΩ, 1.1A, SMD 0603; Manufacturer: Sunlord; Manufacturer Part Number: SDWL1608CP12NJSTF; Self-Resonant Frequency: 250MHz; Q Factor: 37@250MHz; Package Size: 0603; JLCPCB Basic Part: No; JLCPCB Part Number: C370356; Supplier 1: LCSC; Category: Inductors; Supplier Part Number 1: C370356; Tolerance: ±5%; Rated Current: 1.1A; DC Resistance: 115mΩ; RoHS: Yes; ComponentLink1Description: Datasheet; ComponentLink1URL: https://wmsc.lcsc.com/wmsc/upload/file/pdf/v2/lcsc/2109161630_Sunlord-SDWL1608CP12NJSTF_C370356.pdf; ComponentLink2Description: JLCPCB Part URL; ComponentLink2URL: https://jlcpcb.com/partdetail/C370356; ComponentLink3Description: LCSC Part URL; ComponentLink3URL: https://lcsc.com/product-detail/Inductors-SMD_Sunlord-Sunlord-SDWL1608CP12NJSTF_C370356.html
footprint IND-0603 (0603 (1608M) Inductor)
pins: 1, 2

## SDWL1608CP18NJSTF
designator L?  Inductance: 18nH
Inductor, 18nH, ±5%, 70mΩ, 1.2A, SMD 0603; Manufacturer: Sunlord; Manufacturer Part Number: SDWL1608CP18NJSTF; Self-Resonant Frequency: 250MHz; Q Factor: 41@250MHz; Package Size: 0603; JLCPCB Basic Part: No; JLCPCB Part Number: C391221; Supplier 1: LCSC; Category: Inductors; Supplier Part Number 1: C391221; Tolerance: ±5%; Rated Current: 1.2A; DC Resistance: 70mΩ; RoHS: Yes; ComponentLink1Description: Datasheet; ComponentLink1URL: https://wmsc.lcsc.com/wmsc/upload/file/pdf/v2/lcsc/2110081530_Sunlord-SDWL1608CP18NJSTF_C391221.pdf; ComponentLink2Description: JLCPCB Part URL; ComponentLink2URL: https://jlcpcb.com/partdetail/C391221; ComponentLink3Description: LCSC Part URL; ComponentLink3URL: https://lcsc.com/product-detail/Inductors-SMD_Sunlord-Sunlord-SDWL1608CP18NJSTF_C391221.html
footprint IND-0603 (0603 (1608M) Inductor)
pins: 1, 2

## SDWL1608CP33NJSTF
designator L?  Inductance: 33nH
Inductor, 33nH, ±5%, 220mΩ, 680mA, SMD 0603; Manufacturer: Sunlord; Manufacturer Part Number: SDWL1608CP33NJSTF; Self-Resonant Frequency: 250MHz; Q Factor: 45@250MHz; Package Size: 0603; JLCPCB Basic Part: No; JLCPCB Part Number: C391223; Supplier 1: LCSC; Category: Inductors; Supplier Part Number 1: C391223; Tolerance: ±5%; Rated Current: 680mA; DC Resistance: 220mΩ; RoHS: Yes; ComponentLink1Description: Datasheet; ComponentLink1URL: https://wmsc.lcsc.com/wmsc/upload/file/pdf/v2/lcsc/2110081530_Sunlord-SDWL1608CP33NJSTF_C391223.pdf; ComponentLink2Description: JLCPCB Part URL; ComponentLink2URL: https://jlcpcb.com/partdetail/C391223; ComponentLink3Description: LCSC Part URL; ComponentLink3URL: https://lcsc.com/product-detail/Inductors-SMD_Sunlord-Sunlord-SDWL1608CP33NJSTF_C391223.html
footprint IND-0603 (0603 (1608M) Inductor)
pins: 1, 2

## SDWL1608CP39NJSTF
designator L?  Inductance: 39nH
Inductor, 39nH, ±5%, 250mΩ, 680mA, SMD 0603; Manufacturer: Sunlord; Manufacturer Part Number: SDWL1608CP39NJSTF; Self-Resonant Frequency: 250MHz; Q Factor: 44@250MHz; Package Size: 0603; JLCPCB Basic Part: No; JLCPCB Part Number: C391224; Supplier 1: LCSC; Category: Inductors; Supplier Part Number 1: C391224; Tolerance: ±5%; Rated Current: 680mA; DC Resistance: 250mΩ; RoHS: Yes; ComponentLink1Description: Datasheet; ComponentLink1URL: https://wmsc.lcsc.com/wmsc/upload/file/pdf/v2/lcsc/2110081530_Sunlord-SDWL1608CP39NJSTF_C391224.pdf; ComponentLink2Description: JLCPCB Part URL; ComponentLink2URL: https://jlcpcb.com/partdetail/C391224; ComponentLink3Description: LCSC Part URL; ComponentLink3URL: https://lcsc.com/product-detail/Inductors-SMD_Sunlord-Sunlord-SDWL1608CP39NJSTF_C391224.html
footprint IND-0603 (0603 (1608M) Inductor)
pins: 1, 2

## SDWL1608CPR12JSTF
designator L?  Inductance: 120nH
Inductor, 120nH, ±5%, 720mΩ, 420mA, SMD 0603; Manufacturer: Sunlord; Manufacturer Part Number: SDWL1608CPR12JSTF; Self-Resonant Frequency: 150MHz; Q Factor: 47@250MHz; Package Size: 0603; JLCPCB Basic Part: No; JLCPCB Part Number: C361508; Supplier 1: LCSC; Category: Inductors; Supplier Part Number 1: C361508; Tolerance: ±5%; Rated Current: 420mA; DC Resistance: 720mΩ; RoHS: Yes; ComponentLink1Description: Datasheet; ComponentLink1URL: https://wmsc.lcsc.com/wmsc/upload/file/pdf/v2/lcsc/2110081430_Sunlord-SDWL1608CPR12JSTF_C361508.pdf; ComponentLink2Description: JLCPCB Part URL; ComponentLink2URL: https://jlcpcb.com/partdetail/C361508; ComponentLink3Description: LCSC Part URL; ComponentLink3URL: https://lcsc.com/product-detail/Inductors-SMD_Sunlord-Sunlord-SDWL1608CPR12JSTF_C361508.html
footprint IND-0603 (0603 (1608M) Inductor)
pins: 1, 2

## SDWL1608CR10GSTF
designator L?  Inductance: 100nH
Inductor, 100nH, ±2%, 660mΩ, 260mA, SMD 0603; Manufacturer: Sunlord; Manufacturer Part Number: SDWL1608CR10GSTF; Package Size: 0603; JLCPCB Basic Part: No; JLCPCB Part Number: C370359; Supplier 1: LCSC; Category: Inductors; Supplier Part Number 1: C370359; Tolerance: ±2%; Rated Current: 260mA; DC Resistance: 660mΩ; RoHS: Yes; ComponentLink1Description: Datasheet; ComponentLink1URL: https://wmsc.lcsc.com/wmsc/upload/file/pdf/v2/lcsc/2109161630_Sunlord-SDWL1608CR10GSTF_C370359.pdf; ComponentLink2Description: JLCPCB Part URL; ComponentLink2URL: https://jlcpcb.com/partdetail/C370359; ComponentLink3Description: LCSC Part URL; ComponentLink3URL: https://lcsc.com/product-detail/Inductors-SMD_Sunlord-Sunlord-SDWL1608CR10GSTF_C370359.html
footprint IND-0603 (0603 (1608M) Inductor)
pins: 1, 2

## SDWL1608CR10JSTF
designator L?  Inductance: 100nH
Inductor, 100nH, ±5%, 660mΩ, 260mA, SMD 0603; Manufacturer: Sunlord; Manufacturer Part Number: SDWL1608CR10JSTF; Package Size: 0603; JLCPCB Basic Part: No; JLCPCB Part Number: C279920; Supplier 1: LCSC; Category: Inductors; Supplier Part Number 1: C279920; Tolerance: ±5%; Rated Current: 260mA; DC Resistance: 660mΩ; RoHS: Yes; ComponentLink1Description: Datasheet; ComponentLink1URL: https://wmsc.lcsc.com/wmsc/upload/file/pdf/v2/lcsc/2110081430_Sunlord-SDWL1608CR10JSTF_C279920.pdf; ComponentLink2Description: JLCPCB Part URL; ComponentLink2URL: https://jlcpcb.com/partdetail/C279920; ComponentLink3Description: LCSC Part URL; ComponentLink3URL: https://lcsc.com/product-detail/Inductors-SMD_Sunlord-Sunlord-SDWL1608CR10JSTF_C279920.html
footprint IND-0603 (0603 (1608M) Inductor)
pins: 1, 2

## SDWL1608CR10JSTFM01
designator L?  Inductance: 100nH
Inductor, 100nH, ±5%, 680mΩ, 220mA, SMD 0603; Manufacturer: Sunlord; Manufacturer Part Number: SDWL1608CR10JSTFM01; Self-Resonant Frequency: 100MHz; Q Factor: 34@150MHz; Package Size: 0603; JLCPCB Basic Part: No; JLCPCB Part Number: C408750; Supplier 1: LCSC; Category: Inductors; Supplier Part Number 1: C408750; Tolerance: ±5%; Rated Current: 220mA; DC Resistance: 680mΩ; RoHS: Yes; ComponentLink1Description: Datasheet; ComponentLink1URL: https://wmsc.lcsc.com/wmsc/upload/file/pdf/v2/lcsc/2109161630_Sunlord-SDWL1608CR10JSTFM01_C408750.pdf; ComponentLink2Description: JLCPCB Part URL; ComponentLink2URL: https://jlcpcb.com/partdetail/C408750; ComponentLink3Description: LCSC Part URL; ComponentLink3URL: https://lcsc.com/product-detail/Inductors-SMD_Sunlord-Sunlord-SDWL1608CR10JSTFM01_C408750.html
footprint IND-0603 (0603 (1608M) Inductor)
pins: 1, 2

## SDWL1608CR10JSTFN01
designator L?  Inductance: 100nH
Inductor, 100nH, ±5%, SMD 0603; Manufacturer: Sunlord; Manufacturer Part Number: SDWL1608CR10JSTFN01; Package Size: 0603; JLCPCB Basic Part: No; JLCPCB Part Number: C370360; Supplier 1: LCSC; Category: Inductors; Supplier Part Number 1: C370360; Tolerance: ±5%; RoHS: Yes; ComponentLink1Description: Datasheet; ComponentLink2Description: JLCPCB Part URL; ComponentLink2URL: https://jlcpcb.com/partdetail/C370360; ComponentLink3Description: LCSC Part URL; ComponentLink3URL: https://lcsc.com/product-detail/Inductors-SMD_Sunlord-Sunlord-SDWL1608CR10JSTFN01_C370360.html
footprint IND-0603 (0603 (1608M) Inductor)
pins: 1, 2

## SDWL1608CR12GSTF
designator L?  Inductance: 120nH
Inductor, 120nH, ±2%, 750mΩ, 240mA, SMD 0603; Manufacturer: Sunlord; Manufacturer Part Number: SDWL1608CR12GSTF; Package Size: 0603; JLCPCB Basic Part: No; JLCPCB Part Number: C370361; Supplier 1: LCSC; Category: Inductors; Supplier Part Number 1: C370361; Tolerance: ±2%; Rated Current: 240mA; DC Resistance: 750mΩ; RoHS: Yes; ComponentLink1Description: Datasheet; ComponentLink1URL: https://wmsc.lcsc.com/wmsc/upload/file/pdf/v2/lcsc/2110081530_Sunlord-SDWL1608CR12GSTF_C370361.pdf; ComponentLink2Description: JLCPCB Part URL; ComponentLink2URL: https://jlcpcb.com/partdetail/C370361; ComponentLink3Description: LCSC Part URL; ComponentLink3URL: https://lcsc.com/product-detail/Inductors-SMD_Sunlord-Sunlord-SDWL1608CR12GSTF_C370361.html
footprint IND-0603 (0603 (1608M) Inductor)
pins: 1, 2

## SDWL1608CR12JSTFM01
designator L?  Inductance: 120nH
Inductor, 120nH, ±5%, 1.3Ω, 180mA, SMD 0603; Manufacturer: Sunlord; Manufacturer Part Number: SDWL1608CR12JSTFM01; Self-Resonant Frequency: 100MHz; Q Factor: 32@150MHz; Package Size: 0603; JLCPCB Basic Part: No; JLCPCB Part Number: C408752; Supplier 1: LCSC; Category: Inductors; Supplier Part Number 1: C408752; Tolerance: ±5%; Rated Current: 180mA; DC Resistance: 1.3Ω; RoHS: Yes; ComponentLink1Description: Datasheet; ComponentLink1URL: https://wmsc.lcsc.com/wmsc/upload/file/pdf/v2/lcsc/2110081530_Sunlord-SDWL1608CR12JSTFM01_C408752.pdf; ComponentLink2Description: JLCPCB Part URL; ComponentLink2URL: https://jlcpcb.com/partdetail/C408752; ComponentLink3Description: LCSC Part URL; ComponentLink3URL: https://lcsc.com/product-detail/Inductors-SMD_Sunlord-Sunlord-SDWL1608CR12JSTFM01_C408752.html
footprint IND-0603 (0603 (1608M) Inductor)
pins: 1, 2

## SDWL1608CR13JSTFM01
designator L?  Inductance: 130nH
Inductor, 130nH, ±5%, 1.4Ω, 170mA, SMD 0603; Manufacturer: Sunlord; Manufacturer Part Number: SDWL1608CR13JSTFM01; Self-Resonant Frequency: 100MHz; Q Factor: 32@150MHz; Package Size: 0603; JLCPCB Basic Part: No; JLCPCB Part Number: C408753; Supplier 1: LCSC; Category: Inductors; Supplier Part Number 1: C408753; Tolerance: ±5%; Rated Current: 170mA; DC Resistance: 1.4Ω; RoHS: Yes; ComponentLink1Description: Datasheet; ComponentLink1URL: https://wmsc.lcsc.com/wmsc/upload/file/pdf/v2/lcsc/2110081530_Sunlord-SDWL1608CR13JSTFM01_C408753.pdf; ComponentLink2Description: JLCPCB Part URL; ComponentLink2URL: https://jlcpcb.com/partdetail/C408753; ComponentLink3Description: LCSC Part URL; ComponentLink3URL: https://lcsc.com/product-detail/Inductors-SMD_Sunlord-Sunlord-SDWL1608CR13JSTFM01_C408753.html
footprint IND-0603 (0603 (1608M) Inductor)
pins: 1, 2

## SDWL1608CR16JSTF
designator L?  Inductance: 160nH
Inductor, 160nH, ±5%, 1.12Ω, 200mA, SMD 0603; Manufacturer: Sunlord; Manufacturer Part Number: SDWL1608CR16JSTF; Package Size: 0603; JLCPCB Basic Part: No; JLCPCB Part Number: C279715; Supplier 1: LCSC; Category: Inductors; Supplier Part Number 1: C279715; Tolerance: ±5%; Rated Current: 200mA; DC Resistance: 1.12Ω; RoHS: Yes; ComponentLink1Description: Datasheet; ComponentLink1URL: https://wmsc.lcsc.com/wmsc/upload/file/pdf/v2/lcsc/2110081330_Sunlord-SDWL1608CR16JSTF_C279715.pdf; ComponentLink2Description: JLCPCB Part URL; ComponentLink2URL: https://jlcpcb.com/partdetail/C279715; ComponentLink3Description: LCSC Part URL; ComponentLink3URL: https://lcsc.com/product-detail/Inductors-SMD_Sunlord-Sunlord-SDWL1608CR16JSTF_C279715.html
footprint IND-0603 (0603 (1608M) Inductor)
pins: 1, 2

## SDWL1608CR16JSTFM01
designator L?  Inductance: 160nH
Inductor, 160nH, ±5%, 2.1Ω, 150mA, SMD 0603; Manufacturer: Sunlord; Manufacturer Part Number: SDWL1608CR16JSTFM01; Self-Resonant Frequency: 100MHz; Q Factor: 32@150MHz; Package Size: 0603; JLCPCB Basic Part: No; JLCPCB Part Number: C408755; Supplier 1: LCSC; Category: Inductors; Supplier Part Number 1: C408755; Tolerance: ±5%; Rated Current: 150mA; DC Resistance: 2.1Ω; RoHS: Yes; ComponentLink1Description: Datasheet; ComponentLink1URL: https://wmsc.lcsc.com/wmsc/upload/file/pdf/v2/lcsc/2110081530_Sunlord-SDWL1608CR16JSTFM01_C408755.pdf; ComponentLink2Description: JLCPCB Part URL; ComponentLink2URL: https://jlcpcb.com/partdetail/C408755; ComponentLink3Description: LCSC Part URL; ComponentLink3URL: https://lcsc.com/product-detail/Inductors-SMD_Sunlord-Sunlord-SDWL1608CR16JSTFM01_C408755.html
footprint IND-0603 (0603 (1608M) Inductor)
pins: 1, 2

## SDWL1608CR18GSTF
designator L?  Inductance: 180nH
Inductor, 180nH, ±2%, 1.38Ω, 180mA, SMD 0603; Manufacturer: Sunlord; Manufacturer Part Number: SDWL1608CR18GSTF; Package Size: 0603; JLCPCB Basic Part: No; JLCPCB Part Number: C370364; Supplier 1: LCSC; Category: Inductors; Supplier Part Number 1: C370364; Tolerance: ±2%; Rated Current: 180mA; DC Resistance: 1.38Ω; RoHS: Yes; ComponentLink1Description: Datasheet; ComponentLink1URL: https://wmsc.lcsc.com/wmsc/upload/file/pdf/v2/lcsc/2110081530_Sunlord-SDWL1608CR18GSTF_C370364.pdf; ComponentLink2Description: JLCPCB Part URL; ComponentLink2URL: https://jlcpcb.com/partdetail/C370364; ComponentLink3Description: LCSC Part URL; ComponentLink3URL: https://lcsc.com/product-detail/Inductors-SMD_Sunlord-Sunlord-SDWL1608CR18GSTF_C370364.html
footprint IND-0603 (0603 (1608M) Inductor)
pins: 1, 2